# Altium footprint library ICs And Semiconductors THD.PcbLib: 507 footprints (part 31 of 32) (continued)
## VICOR_VxxCxxxxxxBF [mm] "VICOR  Micro DC-DC Converters, Short Pin RoHS, Slotted Baseplate" (continued)
3D body "VICOR_VxxCxxxxxxBF.stp": height 10.9, standoff -2.88, extent -28.956,-18.415 28.956,18.415

## VICOR_VxxCxxxxxxBF2 [mm] "VICOR  Micro DC-DC Converters, Short Pin RoHS, Threaded Baseplate"
height 12.7
pads (13):
  rect 5.8x6 hole 2.4: 1(-25.4,10.16) 2(-25.4,3.175) 3(-25.4,-3.175) 4(-25.4,-10.16) 5(25.4,-10.16) 6(25.4,0) 7(25.4,10.16)
  round 3.7 hole 3: MECH1(-16.51,-16.129) MECH2(0,-16.129) MECH3(16.51,-16.129) MECH4(16.51,16.129) MECH5(0,16.129) MECH6(-16.51,16.129)
Top Layer:
  region: -18.064,14.045 -18.251,14.184 -18.569,14.525 -18.822,14.916 -19.001,15.346 -19.101,15.801 -19.119,16.266 -19.053,16.728 -18.907,17.17 -18.684,17.579 -18.392,17.942 -18.04,18.248 -17.64,18.486 -17.203,18.649 -16.745,18.731 -16.279,18.731 -15.82,18.649 -15.384,18.486 -14.983,18.248 -14.632,17.942 -14.34,17.579 -14.117,17.17 -13.97,16.728 -13.905,16.266 -13.922,15.801 -14.022,15.346 -14.202,14.916 -14.454,14.525 -14.773,14.184 -14.96,14.045
  region: -1.554,14.045 -1.741,14.184 -2.059,14.525 -2.312,14.916 -2.491,15.346 -2.591,15.801 -2.609,16.266 -2.543,16.728 -2.397,17.17 -2.174,17.579 -1.882,17.942 -1.53,18.248 -1.13,18.486 -0.693,18.649 -0.235,18.731 0.231,18.731 0.69,18.649 1.126,18.486 1.527,18.248 1.879,17.942 2.17,17.579 2.393,17.17 2.54,16.728 2.605,16.266 2.588,15.801 2.488,15.346 2.308,14.916 2.056,14.525 1.737,14.184 1.55,14.045
  region: 14.956,14.045 14.769,14.184 14.451,14.525 14.198,14.916 14.019,15.346 13.919,15.801 13.901,16.266 13.967,16.728 14.113,17.17 14.336,17.579 14.628,17.942 14.98,18.248 15.38,18.486 15.817,18.649 16.275,18.731 16.741,18.731 17.2,18.649 17.636,18.486 18.037,18.248 18.389,17.942 18.68,17.579 18.903,17.17 19.05,16.728 19.115,16.266 19.098,15.801 18.998,15.346 18.818,14.916 18.566,14.525 18.247,14.184 18.06,14.045
  region: 18.064,-14.045 18.251,-14.184 18.569,-14.525 18.822,-14.916 19.001,-15.346 19.101,-15.801 19.119,-16.266 19.053,-16.728 18.907,-17.17 18.684,-17.579 18.392,-17.942 18.04,-18.248 17.64,-18.486 17.203,-18.649 16.745,-18.731 16.279,-18.731 15.82,-18.649 15.384,-18.486 14.983,-18.248 14.632,-17.942 14.34,-17.579 14.117,-17.17 13.97,-16.728 13.905,-16.266 13.922,-15.801 14.022,-15.346 14.202,-14.916 14.455,-14.525 14.773,-14.184 14.96,-14.045
  region: 1.554,-14.045 1.741,-14.184 2.059,-14.525 2.312,-14.916 2.491,-15.346 2.591,-15.801 2.609,-16.266 2.543,-16.728 2.397,-17.17 2.174,-17.579 1.882,-17.942 1.53,-18.248 1.13,-18.486 0.693,-18.649 0.235,-18.731 -0.231,-18.731 -0.69,-18.649 -1.126,-18.486 -1.527,-18.248 -1.878,-17.942 -2.17,-17.579 -2.393,-17.17 -2.54,-16.728 -2.605,-16.266 -2.588,-15.801 -2.488,-15.346 -2.308,-14.916 -2.055,-14.525 -1.737,-14.184 -1.55,-14.045
  region: -14.956,-14.045 -14.769,-14.184 -14.451,-14.525 -14.198,-14.916 -14.019,-15.346 -13.919,-15.801 -13.901,-16.266 -13.967,-16.728 -14.113,-17.17 -14.336,-17.579 -14.628,-17.942 -14.98,-18.248 -15.38,-18.486 -15.817,-18.649 -16.275,-18.731 -16.741,-18.731 -17.2,-18.649 -17.636,-18.486 -18.037,-18.248 -18.388,-17.942 -18.68,-17.579 -18.903,-17.17 -19.05,-16.728 -19.115,-16.266 -19.098,-15.801 -18.998,-15.346 -18.818,-14.916 -18.565,-14.525 -18.247,-14.184 -18.06,-14.045
Bottom Layer:
  region: -18.064,14.045 -18.251,14.184 -18.569,14.525 -18.822,14.916 -19.001,15.346 -19.101,15.801 -19.119,16.266 -19.053,16.728 -18.907,17.17 -18.684,17.579 -18.392,17.942 -18.04,18.248 -17.64,18.486 -17.203,18.649 -16.745,18.731 -16.279,18.731 -15.82,18.649 -15.384,18.486 -14.983,18.248 -14.632,17.942 -14.34,17.579 -14.117,17.17 -13.97,16.728 -13.905,16.266 -13.922,15.801 -14.022,15.346 -14.202,14.916 -14.454,14.525 -14.773,14.184 -14.96,14.045
  region: -1.554,14.045 -1.741,14.184 -2.059,14.525 -2.312,14.916 -2.491,15.346 -2.591,15.801 -2.609,16.266 -2.543,16.728 -2.397,17.17 -2.174,17.579 -1.882,17.942 -1.53,18.248 -1.13,18.486 -0.693,18.649 -0.235,18.731 0.231,18.731 0.69,18.649 1.126,18.486 1.527,18.248 1.879,17.942 2.17,17.579 2.393,17.17 2.54,16.728 2.605,16.266 2.588,15.801 2.488,15.346 2.308,14.916 2.056,14.525 1.737,14.184 1.55,14.045
  region: 14.956,14.045 14.769,14.184 14.451,14.525 14.198,14.916 14.019,15.346 13.919,15.801 13.901,16.266 13.967,16.728 14.113,17.17 14.336,17.579 14.628,17.942 14.98,18.248 15.38,18.486 15.817,18.649 16.275,18.731 16.741,18.731 17.2,18.649 17.636,18.486 18.037,18.248 18.389,17.942 18.68,17.579 18.903,17.17 19.05,16.728 19.115,16.266 19.098,15.801 18.998,15.346 18.818,14.916 18.566,14.525 18.247,14.184 18.06,14.045
  region: 18.064,-14.045 18.251,-14.184 18.569,-14.525 18.822,-14.916 19.001,-15.346 19.101,-15.801 19.119,-16.266 19.053,-16.728 18.907,-17.17 18.684,-17.579 18.392,-17.942 18.04,-18.248 17.64,-18.486 17.203,-18.649 16.745,-18.731 16.279,-18.731 15.82,-18.649 15.384,-18.486 14.983,-18.248 14.632,-17.942 14.34,-17.579 14.117,-17.17 13.97,-16.728 13.905,-16.266 13.922,-15.801 14.022,-15.346 14.202,-14.916 14.455,-14.525 14.773,-14.184 14.96,-14.045
  region: 1.554,-14.045 1.741,-14.184 2.059,-14.525 2.312,-14.916 2.491,-15.346 2.591,-15.801 2.609,-16.266 2.543,-16.728 2.397,-17.17 2.174,-17.579 1.882,-17.942 1.53,-18.248 1.13,-18.486 0.693,-18.649 0.235,-18.731 -0.231,-18.731 -0.69,-18.649 -1.126,-18.486 -1.527,-18.248 -1.878,-17.942 -2.17,-17.579 -2.393,-17.17 -2.54,-16.728 -2.605,-16.266 -2.588,-15.801 -2.488,-15.346 -2.308,-14.916 -2.055,-14.525 -1.737,-14.184 -1.55,-14.045
  region: -14.956,-14.045 -14.769,-14.184 -14.451,-14.525 -14.198,-14.916 -14.019,-15.346 -13.919,-15.801 -13.901,-16.266 -13.967,-16.728 -14.113,-17.17 -14.336,-17.579 -14.628,-17.942 -14.98,-18.248 -15.38,-18.486 -15.817,-18.649 -16.275,-18.731 -16.741,-18.731 -17.2,-18.649 -17.636,-18.486 -18.037,-18.248 -18.388,-17.942 -18.68,-17.579 -18.903,-17.17 -19.05,-16.728 -19.115,-16.266 -19.098,-15.801 -18.998,-15.346 -18.818,-14.916 -18.565,-14.525 -18.247,-14.184 -18.06,-14.045
Top Overlay:
  lines w0.2: -18.82,-18.415 -27.432,-18.415 cw(c-27.432,-16.891) -28.956,-16.891 -28.956,13.553 cw(c-26.416,13.553) -28.212,15.349 -25.146,18.415 -18.82,18.415 ; -14.2,-18.415 -2.31,-18.415 ; -14.2,18.415 -2.31,18.415 ; 2.31,-18.415 14.2,-18.415 ; 2.31,18.415 14.2,18.415 ; 18.82,-18.415 27.432,-18.415 ccw(c27.432,-16.891) 28.956,-16.891 28.956,16.891 ccw(c27.432,16.891) 27.432,18.415 18.82,18.415
Keep-Out Layer:
  board cut-out: -20.52,-13.836 -20.668,-13.836 -20.958,-13.778 -21.231,-13.665 -21.476,-13.501 -21.685,-13.292 -21.849,-13.046 -21.962,-12.773 -22.02,-12.483 -22.02,-12.336 -22.02,12.35 -22.02,12.498 -21.962,12.788 -21.849,13.061 -21.685,13.306 -21.476,13.515 -21.231,13.68 -20.958,13.793 -20.668,13.85 -20.52,13.85 20.52,13.85 20.668,13.85 20.958,13.793 21.231,13.68 21.476,13.515 21.685,13.306 21.849,13.061 21.962,12.788 22.02,12.498 22.02,12.35 22.02,-12.336 22.02,-12.483 21.962,-12.773 21.849,-13.046 21.685,-13.292 21.476,-13.501 21.231,-13.665 20.958,-13.778 20.668,-13.836 20.52,-13.836
Mechanical 1:
  lines w1.27: -22.02,-12.343 ccw(c-20.52,-12.343) -20.52,-13.843 20.52,-13.843 ccw(c20.52,-12.343) 22.02,-12.343 22.02,12.343 ccw(c20.52,12.343) 20.52,13.843 -20.52,13.843 ccw(c-20.52,12.343) -22.02,12.343 -22.02,-12.343
Notvisible:
  circle w0.1: c-16.51,16.129 r1.5
  circle w0.1: c0,16.129 r1.5
  circle w0.1: c16.51,16.129 r1.5
  circle w0.1: c16.51,-16.129 r1.5
  circle w0.1: c-16.51,-16.129 r1.5
  circle w0.1: c0,-16.129 r1.5
  lines w0.1: -25.9,-10.16 -25.4,-10.16 ; -25.9,-3.175 -25.4,-3.175 ; -25.9,3.175 -25.4,3.175 ; -25.9,10.16 -25.4,10.16 ; -25.4,-10.66 -25.4,-10.16 ; -25.4,-9.66 -25.4,-10.16 ; -25.4,-3.675 -25.4,-3.175 ; -25.4,-2.675 -25.4,-3.175 ; -25.4,2.675 -25.4,3.175 ; -25.4,3.675 -25.4,3.175 ; -25.4,9.66 -25.4,10.16 ; -25.4,10.66 -25.4,10.16 ; -24.9,-10.16 -25.4,-10.16 ; -24.9,-3.175 -25.4,-3.175 ; -24.9,3.175 -25.4,3.175 ; -24.9,10.16 -25.4,10.16 ; -24.63,-16.129 -24.13,-16.129 ; -24.63,16.129 -24.13,16.129 ; -24.13,-16.629 -24.13,-16.129 ; -24.13,-15.629 -24.13,-16.129 ; -24.13,15.629 -24.13,16.129 ; -24.13,16.629 -24.13,16.129 ; -23.63,-16.129 -24.13,-16.129 ; -23.63,16.129 -24.13,16.129 ; -0.5,0 0,0 ; 0,-0.5 0,0 ; 0,0.5 0,0 ; 0.5,0 0,0 ; 23.63,-16.129 24.13,-16.129 ; 23.63,16.129 24.13,16.129 ; 24.13,-16.629 24.13,-16.129 ; 24.13,-15.629 24.13,-16.129 ; 24.13,15.629 24.13,16.129 ; 24.13,16.629 24.13,16.129 ; 24.63,-16.129 24.13,-16.129 ; 24.63,16.129 24.13,16.129 ; 24.9,-10.16 25.4,-10.16 ; 24.9,0 25.4,0 ; 24.9,10.16 25.4,10.16 ; 25.4,-10.66 25.4,-10.16 ; 25.4,-9.66 25.4,-10.16 ; 25.4,-0.5 25.4,0 ; 25.4,0.5 25.4,0 ; 25.4,9.66 25.4,10.16 ; 25.4,10.66 25.4,10.16 ; 25.9,-10.16 25.4,-10.16 ; 25.9,0 25.4,0 ; 25.9,10.16 25.4,10.16 ; -18.062,-14.043 ccw(c-16.51,-16.129) -14.958,-14.043 ; -18.062,-14.043 ccw(c-16.51,-16.129) -14.958,-14.043 ; -18.062,-14.043 -14.958,-14.043 ; -18.062,14.043 cw(c-16.51,16.129) -14.958,14.043 ; -18.062,14.043 cw(c-16.51,16.129) -14.958,14.043 ; -18.062,14.043 -14.958,14.043 ; -16.51,-16.129 -17.01,-16.129 -16.51,-16.129 ; -16.51,-16.129 -16.51,-15.629 -16.51,-16.129 ; -16.51,-16.129 -16.01,-16.129 -16.51,-16.129 ; -16.51,-16.129 -16.51,-16.629 -16.51,-16.129 ; -16.51,16.129 -17.01,16.129 -16.51,16.129 ; -16.51,16.129 -16.51,16.629 -16.51,16.129 ; -16.51,16.129 -16.01,16.129 -16.51,16.129 ; -16.51,16.129 -16.51,15.629 -16.51,16.129 ; -1.552,-14.043 ccw(c0,-16.129) 1.552,-14.043 ; -1.552,-14.043 ccw(c0,-16.129) 1.552,-14.043 ; -1.552,-14.043 1.552,-14.043 ; -1.552,14.043 cw(c0,16.129) 1.552,14.043 ; -1.552,14.043 cw(c0,16.129) 1.552,14.043 ; -1.552,14.043 1.552,14.043 ; 0,-16.129 -0.5,-16.129 0,-16.129 ; 0,-16.129 0,-15.629 0,-16.129 ; 0,-16.129 0.5,-16.129 0,-16.129 ; 0,-16.129 0,-16.629 0,-16.129 ; 0,16.129 -0.5,16.129 0,16.129 ; 0,16.129 0,16.629 0,16.129 ; 0,16.129 0.5,16.129 0,16.129 ; 0,16.129 0,15.629 0,16.129 ; 14.958,-14.043 ccw(c16.51,-16.129) 18.062,-14.043 ; 14.958,-14.043 ccw(c16.51,-16.129) 18.062,-14.043 ; 14.958,-14.043 18.062,-14.043 ; 14.958,14.043 cw(c16.51,16.129) 18.062,14.043 ; 14.958,14.043 cw(c16.51,16.129) 18.062,14.043 ; 14.958,14.043 18.062,14.043 ; 16.51,-16.129 16.01,-16.129 16.51,-16.129 ; 16.51,-16.129 16.51,-15.629 16.51,-16.129 ; 16.51,-16.129 17.01,-16.129 16.51,-16.129 ; 16.51,-16.129 16.51,-16.629 16.51,-16.129 ; 16.51,16.129 16.01,16.129 16.51,16.129 ; 16.51,16.129 16.51,16.629 16.51,16.129 ; 16.51,16.129 17.01,16.129 16.51,16.129 ; 16.51,16.129 16.51,15.629 16.51,16.129 ; -22.02,-12.343 ccw(c-20.52,-12.343) -20.52,-13.843 20.52,-13.843 ccw(c20.52,-12.343) 22.02,-12.343 22.02,12.343 ccw(c20.52,12.343) 20.52,13.843 -20.52,13.843 ccw(c-20.52,12.343) -22.02,12.343 -22.02,-12.343
Mechanical 14:
  circle w0.1: c-24.13,-16.129 r1.13
  circle w0.1: c-16.51,-16.129 r1.13
  circle w0.1: c0,-16.129 r1.13
  circle w0.1: c16.51,-16.129 r1.13
  circle w0.1: c24.13,-16.129 r1.13
  circle w0.1: c24.13,16.129 r1.13
  circle w0.1: c16.51,16.129 r1.13
  circle w0.1: c0,16.129 r1.13
  circle w0.1: c-16.51,16.129 r1.13
  circle w0.1: c-24.13,16.129 r1.13
  lines w0.1: -28.194,-10.517 -28.194,-9.5 ; -28.194,-8.5 -28.194,-7.5 ; -28.194,-6.5 -28.194,-5.5 ; -28.194,-4.5 -28.194,-3.5 ; -28.194,-2.5 -28.194,-1.5 ; -28.194,-0.5 -28.194,0.5 ; -28.194,1.5 -28.194,2.5 ; -28.194,3.5 -28.194,4.5 ; -28.194,5.5 -28.194,6.5 ; -28.194,7.5 -28.194,8.5 ; -28.194,9.5 -28.194,10.517 ; -28,-11.642 ccw(c-25.655,-10.669) -27,-12.822 ; -28,11.642 cw(c-25.655,10.669) -27,12.822 ; -25.655,-13.208 -23.911,-13.208 ; -25.655,13.208 -23.911,13.208 ; -18.148,-18.415 -27.432,-18.415 cw(c-27.432,-16.891) -28.956,-16.891 -28.956,13.553 cw(c-26.416,13.553) -28.212,15.349 -25.146,18.415 -18.148,18.415 ; -14.872,-18.415 -1.638,-18.415 ; -14.872,18.415 -1.638,18.415 ; 1.638,-18.415 14.872,-18.415 ; 1.638,18.415 14.872,18.415 ; 18.134,-18.415 27.432,-18.415 ccw(c27.432,-16.891) 28.956,-16.891 28.956,16.891 ccw(c27.432,16.891) 27.432,18.415 18.148,18.415 ; 23.911,-13.208 25.655,-13.208 ccw(c25.655,-10.669) 26,-13.184 ; 23.911,13.208 25.655,13.208 ; 27,-12.822 ccw(c25.655,-10.669) 28,-11.642 ; 27,12.822 cw(c25.655,10.669) 28,11.642 ; 28.194,-10.517 28.194,-9.5 ; 28.194,-8.5 28.194,-7.5 ; 28.194,-6.5 28.194,-5.5 ; 28.194,-4.5 28.194,-3.5 ; 28.194,-2.5 28.194,-1.5 ; 28.194,-0.5 28.194,0.5 ; 28.194,1.5 28.194,2.5 ; 28.194,3.5 28.194,4.5 ; 28.194,5.5 28.194,6.5 ; 28.194,7.5 28.194,8.5 ; 28.194,9.5 28.194,10.517
3D body "VICOR_VxxCxxxxxxBF2.stp": height 10.9, standoff -2.8, extent -28.96,-18.417 28.952,18.413

## VISHAY_1.5KE [mm] "VISHAY 1.5KE Case Style, Diode, Axial; Lead Spacing 20.32mm, Lead Dia. 1.07mm, Body Length 9.5mm, Body Dia. 5.3mm"
height 5.3
pads (2):
  round 2.1 hole 1.4: 1(-10.16,0) 2(10.16,0)
Top Overlay:
  lines w0.2: -8.812,-0.535 -4.75,-0.535 ; -8.812,0.535 -4.75,0.535 ; -3.75,-2.65 -3.75,2.65 ; -3.55,-2.65 -3.55,2.65 ; -3.35,-2.65 -3.35,2.65 ; -3.15,-2.65 -3.15,2.65 ; -2.95,-2.65 -2.95,2.65 ; -2.75,-2.65 -2.75,2.65 ; 4.75,-0.535 8.812,-0.535 ; 4.75,0.535 8.812,0.535 ; -4.75,-2.65 -4.75,2.65 4.75,2.65 4.75,-2.65 -4.75,-2.65
Notvisible:
  lines w0.1: -11.16,0 -10.16,0 ; -10.16,-1 -10.16,0 ; -10.16,1 -10.16,0 ; -9.16,0 -10.16,0 ; -1,0 0,0 ; 0,-1 0,0 ; 0,1 0,0 ; 1,0 0,0 ; 9.16,0 10.16,0 ; 10.16,-1 10.16,0 ; 10.16,1 10.16,0 ; 11.16,0 10.16,0
Mechanical 14:
  lines w0.1: -4.75,-0.535 -10.16,-0.535 cw(c-10.16,0) -10.16,0.535 -4.75,0.535 ; -3.75,-2.65 -3.75,2.65 ; -3.55,-2.65 -3.55,2.65 ; -3.35,-2.65 -3.35,2.65 ; -3.15,-2.65 -3.15,2.65 ; -2.95,-2.65 -2.95,2.65 ; -2.75,-2.65 -2.75,2.65 ; 4.75,-0.535 10.16,-0.535 ccw(c10.16,0) 10.16,0.535 4.75,0.535 ; -4.75,-2.65 -4.75,2.65 4.75,2.65 4.75,-2.65 -4.75,-2.65
3D body "VISHAY_1.5KE.stp": height 5.3, standoff -3.8, extent -10.695,-2.65 10.695,2.65

## VISHAY_D-63 [mm] "Three Phase Bridge Bridge, Body 28.5mm x 28.5mm"
height 10
pads (1):
  round 9.65 hole 5.2: 1(0,0)
Top Overlay:
  lines w0.2: -12.65,-9.95 -11.85,-9.95 ; -12.65,-6.05 -11.85,-6.05 ; -12.65,6.05 -11.85,6.05 ; -12.65,9.95 -11.85,9.95 ; -10.975,-8.232 cw(c-10.615,-8.579) -10.2,-8.3 ; -10.975,7.768 cw(c-10.615,7.421) -10.2,7.7 ; -10.175,-8.32 ccw(c-9.794,-7.996) -9.365,-8.254 ; -10.175,7.68 ccw(c-9.794,8.004) -9.365,7.746 ; -1.95,-12.65 -1.95,-11.85 ; -1.95,11.85 -1.95,12.65 ; 1.95,-12.65 1.95,-11.85 ; 1.95,11.85 1.95,12.65 ; 9.325,8.068 cw(c9.685,7.721) 10.1,8 ; 10.125,7.98 ccw(c10.506,8.304) 10.935,8.046 ; 11.85,6.05 12.65,6.05 ; 11.85,9.95 12.65,9.95 ; -14.25,-12.75 ccw(c-12.75,-12.75) -12.75,-14.25 12.75,-14.25 ccw(c12.75,-12.75) 14.25,-12.75 14.25,12.75 ccw(c12.75,12.75) 12.75,14.25 -12.75,14.25 ccw(c-12.75,12.75) -14.25,12.75 -14.25,-12.75 ; -12.65,-11.15 -11.85,-11.15 -11.85,-4.85 -12.65,-4.85 -12.65,-11.15 ; -12.65,4.85 -11.85,4.85 -11.85,11.15 -12.65,11.15 -12.65,4.85 ; -3.15,-12.65 -3.15,-11.85 3.15,-11.85 3.15,-12.65 -3.15,-12.65 ; -3.15,11.85 -3.15,12.65 3.15,12.65 3.15,11.85 -3.15,11.85 ; 11.85,4.85 12.65,4.85 12.65,11.15 11.85,11.15 11.85,4.85
  text "-" at -0.7,9.9 h2
  text "+" at -0.7,-11.4 h2
Notvisible:
  lines w0.1: -1,0 0,0 ; 0,-1 0,0 ; 0,1 0,0 ; 1,0 0,0
Mechanical 14:
  circle w0.1: c0,0 r2.6
  lines w0.1: -14.25,-12.75 ccw(c-12.75,-12.75) -12.75,-14.25 ; -14.25,-12.75 ccw(c-12.75,-12.75) -12.75,-14.25 ; -14.25,-12.75 ccw(c-12.75,-12.75) -12.75,-14.25 ; -14.25,-12.75 -14.25,12.75 ; -14.25,-12.75 -14.25,12.75 ; -14.25,-12.75 -14.25,12.75 ; -14.25,12.75 cw(c-12.75,12.75) -12.75,14.25 ; -14.25,12.75 cw(c-12.75,12.75) -12.75,14.25 ; -14.25,12.75 cw(c-12.75,12.75) -12.75,14.25 ; -12.75,-14.25 12.75,-14.25 ; -12.75,-14.25 12.75,-14.25 ; -12.75,-14.25 12.75,-14.25 ; -12.75,14.25 12.75,14.25 ; -12.75,14.25 12.75,14.25 ; -12.75,14.25 12.75,14.25 ; -12.65,-11.15 -11.85,-11.15 ; -12.65,-11.15 -12.65,-4.85 ; -12.65,-11.15 -12.65,-4.85 ; -12.65,-11.15 -11.85,-11.15 ; -12.65,-11.15 -11.85,-11.15 ; -12.65,-11.15 -12.65,-4.85 ; -12.65,-9.95 -11.85,-9.95 ; -12.65,-9.95 -11.85,-9.95 ; -12.65,-9.95 -11.85,-9.95 ; -12.65,-6.05 -11.85,-6.05 ; -12.65,-6.05 -11.85,-6.05 ; -12.65,-6.05 -11.85,-6.05 ; -12.65,-4.85 -11.85,-4.85 ; -12.65,-4.85 -11.85,-4.85 ; -12.65,-4.85 -11.85,-4.85 ; -12.65,4.85 -11.85,4.85 ; -12.65,4.85 -12.65,11.15 ; -12.65,4.85 -12.65,11.15 ; -12.65,4.85 -11.85,4.85 ; -12.65,4.85 -11.85,4.85 ; -12.65,4.85 -12.65,11.15 ; -12.65,6.05 -11.85,6.05 ; -12.65,6.05 -11.85,6.05 ; -12.65,6.05 -11.85,6.05 ; -12.65,9.95 -11.85,9.95 ; -12.65,9.95 -11.85,9.95 ; -12.65,9.95 -11.85,9.95 ; -12.65,11.15 -11.85,11.15 ; -12.65,11.15 -11.85,11.15 ; -12.65,11.15 -11.85,11.15 ; -11.85,-11.15 -11.85,-4.85 ; -11.85,-11.15 -11.85,-4.85 ; -11.85,-11.15 -11.85,-4.85 ; -11.85,4.85 -11.85,11.15 ; -11.85,4.85 -11.85,11.15 ; -11.85,4.85 -11.85,11.15 ; -3.15,-12.65 -3.15,-11.85 ; -3.15,-12.65 3.15,-12.65 ; -3.15,-12.65 3.15,-12.65 ; -3.15,-12.65 -3.15,-11.85 ; -3.15,-12.65 -3.15,-11.85 ; -3.15,-12.65 3.15,-12.65 ; -3.15,-11.85 3.15,-11.85 ; -3.15,-11.85 3.15,-11.85 ; -3.15,-11.85 3.15,-11.85 ; -3.15,11.85 -3.15,12.65 ; -3.15,11.85 3.15,11.85 ; -3.15,11.85 3.15,11.85 ; -3.15,11.85 -3.15,12.65 ; -3.15,11.85 -3.15,12.65 ; -3.15,11.85 3.15,11.85 ; -3.15,12.65 3.15,12.65 ; -3.15,12.65 3.15,12.65 ; -3.15,12.65 3.15,12.65 ; -1.95,-12.65 -1.95,-11.85 ; -1.95,-12.65 -1.95,-11.85 ; -1.95,-12.65 -1.95,-11.85 ; -1.95,11.85 -1.95,12.65 ; -1.95,11.85 -1.95,12.65 ; -1.95,11.85 -1.95,12.65 ; 1.95,-12.65 1.95,-11.85 ; 1.95,-12.65 1.95,-11.85 ; 1.95,-12.65 1.95,-11.85 ; 1.95,11.85 1.95,12.65 ; 1.95,11.85 1.95,12.65 ; 1.95,11.85 1.95,12.65 ; 3.15,-12.65 3.15,-11.85 ; 3.15,-12.65 3.15,-11.85 ; 3.15,-12.65 3.15,-11.85 ; 3.15,11.85 3.15,12.65 ; 3.15,11.85 3.15,12.65 ; 3.15,11.85 3.15,12.65 ; 11.85,4.85 12.65,4.85 ; 11.85,4.85 11.85,11.15 ; 11.85,4.85 11.85,11.15 ; 11.85,4.85 12.65,4.85 ; 11.85,4.85 12.65,4.85 ; 11.85,4.85 11.85,11.15 ; 11.85,6.05 12.65,6.05 ; 11.85,6.05 12.65,6.05 ; 11.85,6.05 12.65,6.05 ; 11.85,9.95 12.65,9.95 ; 11.85,9.95 12.65,9.95 ; 11.85,9.95 12.65,9.95 ; 11.85,11.15 12.65,11.15 ; 11.85,11.15 12.65,11.15 ; 11.85,11.15 12.65,11.15 ; 12.65,4.85 12.65,11.15 ; 12.65,4.85 12.65,11.15 ; 12.65,4.85 12.65,11.15 ; 12.75,-14.25 ccw(c12.75,-12.75) 14.25,-12.75 ; 12.75,-14.25 ccw(c12.75,-12.75) 14.25,-12.75 ; 12.75,-14.25 ccw(c12.75,-12.75) 14.25,-12.75 ; 12.75,14.25 cw(c12.75,12.75) 14.25,12.75 ; 12.75,14.25 cw(c12.75,12.75) 14.25,12.75 ; 12.75,14.25 cw(c12.75,12.75) 14.25,12.75 ; 14.25,-12.75 14.25,12.75 ; 14.25,-12.75 14.25,12.75 ; 14.25,-12.75 14.25,12.75
  lines w0.2: -10.975,-8.232 cw(c-10.615,-8.579) -10.2,-8.3 ; -10.975,-8.232 cw(c-10.615,-8.579) -10.2,-8.3 ; -10.975,-8.232 cw(c-10.615,-8.579) -10.2,-8.3 ; -10.975,7.768 cw(c-10.615,7.421) -10.2,7.7 ; -10.975,7.768 cw(c-10.615,7.421) -10.2,7.7 ; -10.975,7.768 cw(c-10.615,7.421) -10.2,7.7 ; -10.175,-8.32 ccw(c-9.794,-7.996) -9.365,-8.254 ; -10.175,-8.32 ccw(c-9.794,-7.996) -9.365,-8.254 ; -10.175,-8.32 ccw(c-9.794,-7.996) -9.365,-8.254 ; -10.175,7.68 ccw(c-9.794,8.004) -9.365,7.746 ; -10.175,7.68 ccw(c-9.794,8.004) -9.365,7.746 ; -10.175,7.68 ccw(c-9.794,8.004) -9.365,7.746 ; 9.325,8.068 cw(c9.685,7.721) 10.1,8 ; 9.325,8.068 cw(c9.685,7.721) 10.1,8 ; 9.325,8.068 cw(c9.685,7.721) 10.1,8 ; 10.125,7.98 ccw(c10.506,8.304) 10.935,8.046 ; 10.125,7.98 ccw(c10.506,8.304) 10.935,8.046 ; 10.125,7.98 ccw(c10.506,8.304) 10.935,8.046
  text "-" at -0.7,9.9 h2
  text "+" at -0.7,-11.4 h2
  text "+" at -0.7,-11.4 h2
  text "-" at -0.7,9.9 h2
  text "-" at -0.7,9.9 h2
  text "+" at -0.7,-11.4 h2
3D body "VISHAY_D-63.stp": height 21, standoff 0, extent -14.25,-14.25 14.25,14.25

## VISHAY_GBPC-W [mm] "Glass Passivated Single-Phase Bridge Rectifier, Body 28.8mm x 28.8mm"
height 7.62
pads (4):
  round 1.9 hole 1.4: 1(-9.1,2.2) 2(-9.1,-9.2) 3(9,-9.2) 4(9,8.9)
Top Overlay:
  circle w0.2: c0,0 r2.54
  lines w0.2: -12.275,-9.132 cw(c-11.915,-9.479) -11.5,-9.2 ; -11.475,-9.22 ccw(c-11.094,-8.896) -10.665,-9.154 ; 10.525,8.968 cw(c10.885,8.621) 11.3,8.9 ; 11.325,8.88 ccw(c11.706,9.204) 12.135,8.946 ; -14.45,-14.55 14.35,-14.55 14.35,14.25 -10.864,14.25 -14.45,10.664 -14.45,-14.55
  text "-" at 10.8,-10.1 h2
  text "+" at -12.1,1.2 h2
Notvisible:
  lines w0.1: -10.1,-9.2 -9.1,-9.2 ; -10.1,2.2 -9.1,2.2 ; -9.1,-10.2 -9.1,-9.2 ; -9.1,-8.2 -9.1,-9.2 ; -9.1,1.2 -9.1,2.2 ; -9.1,3.2 -9.1,2.2 ; -8.1,-9.2 -9.1,-9.2 ; -8.1,2.2 -9.1,2.2 ; -1,0 0,0 ; 0,-1 0,0 ; 0,1 0,0 ; 1,0 0,0 ; 8,-9.2 9,-9.2 ; 8,8.9 9,8.9 ; 9,-10.2 9,-9.2 ; 9,-8.2 9,-9.2 ; 9,7.9 9,8.9 ; 9,9.9 9,8.9 ; 10,-9.2 9,-9.2 ; 10,8.9 9,8.9
Mechanical 14:
  circle w0.1: c0,0 r2.54
  lines w0.1: -14.45,-14.55 14.35,-14.55 14.35,14.25 -10.864,14.25 -14.45,10.664 -14.45,-14.55
  lines w0.2: -12.275,-9.132 cw(c-11.915,-9.479) -11.5,-9.2 ; -11.475,-9.22 ccw(c-11.094,-8.896) -10.665,-9.154 ; 10.525,8.968 cw(c10.885,8.621) 11.3,8.9 ; 11.325,8.88 ccw(c11.706,9.204) 12.135,8.946
  text "-" at 10.8,-10.1 h2
  text "+" at -12.1,1.2 h2
3D body "VISHAY_GBPC-W.stp": height 7.62, standoff -3.4, extent -14.45,-14.55 14.35,14.25